# Altium footprint library Standard.PcbLib: 137 footprints (part 6 of 9)
Each footprint in its own frame and in the unit in brackets; x right, y up, seen from the top. Pads: shape width x height; smd on the part's side, far side on the other; paste and mask are expansions set on the pad; w line width, h text height; cw(c..) or ccw(c..) is an arc to the next point about the centre after c.
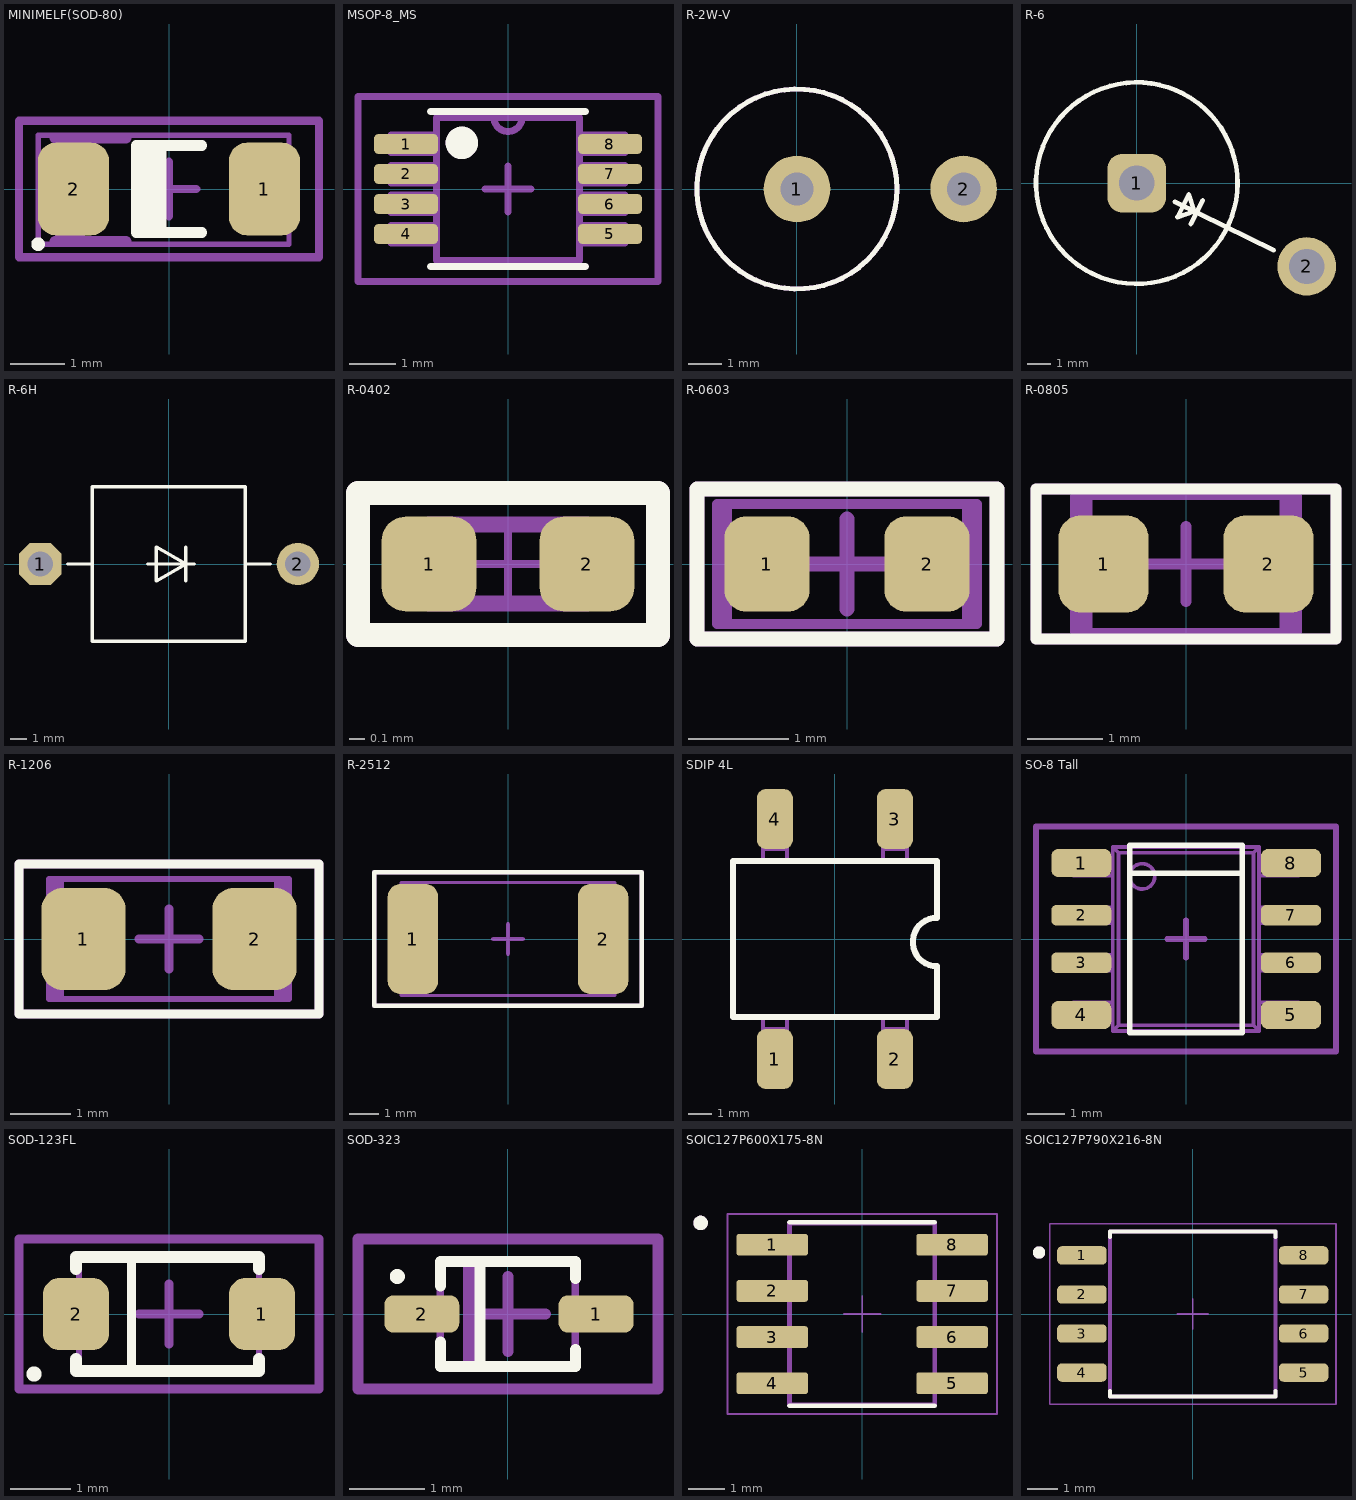
[diagram p5: the footprints below, top view; thin cyan lines are the x and y axes]

## MINIMELF(SOD-80) [mm] "SOD-80, MELF Diode, 2-Leads, Body 3,50x1,45mm, IPC Medium Density"
height 1.6
pads (2):
  rrect50% 1.3x1.7 smd: 1(1.75,0) 2(-1.75,0)
Top Overlay:
  circle w0.15: c-2.4,-1.011 r0.05
  region: -0.05,0.8 -0.6,0.8 -0.6,-0.8 -0.05,-0.8
  lines w0.2: 0.6,-0.8 -0.6,-0.8 -0.6,0.8 0.6,0.8
Top Assembly:
  region: -1.538,0.839 -2.088,0.839 -2.088,-0.961 -1.538,-0.961
  lines w0.1: -2.4,-1.011 2.2,-1.011 2.2,0.989 -2.4,0.989 -2.4,-1.011
  lines w0.2: -2.088,-0.961 -0.788,-0.961 ; -2.088,0.939 -0.788,0.939
Top Component Outline:
  lines w0.15: -0.5,0 0.5,0 ; 0,-0.5 0,0.5 ; -2.75,-1.25 2.75,-1.25 2.75,1.25 -2.75,1.25 -2.75,-1.25
3D body "Minimelf.step": height 1.4, standoff 0, extent -1.75,-0.689 1.75,0.711

## MSOP-8_MS [mil]
pads (8):
  rrect50% 55x17 smd: 1(-87,38.39) 2(-87,12.8) 3(-87,-12.8) 4(-87,-38.39) 5(87,-38.39) 6(87,-12.8) 7(87,12.8) 8(87,38.39)
Top Overlay:
  circle w23.62: c-39.37,39.37 r1.97
  lines w6: -66,-66 66,-66 ; -66,66 66,66
Top Assembly:
  circle w3.94: c-39.37,39.37 r11.81
  lines w6: -61,5 -100,5 -100,20 -61,20 ; -61,31 -100,31 -100,46 -61,46 ; -12,61 ccw(c0,61) 12,61 ; -12,61 12,61 ; -12,61 -61,61 -61,-61 61,-61 61,61 12,61 ; -100,-46 -100,-31 -61,-31 -61,-46 -100,-46 ; -100,-20 -100,-5 -61,-5 -61,-20 -100,-20 ; 61,-46 61,-31 100,-31 100,-46 61,-46 ; 61,-20 61,-5 100,-5 100,-20 61,-20 ; 61,5 61,20 100,20 100,5 61,5 ; 61,31 61,46 100,46 100,31 61,31
Top Component Outline:
  lines w5.91: -19.69,0 19.68,0 ; 0,-19.68 0,19.69 ; -127.95,-78.74 127.95,-78.74 127.95,78.74 -127.95,78.74 -127.95,-78.74
3D body "step_temp.STEP": height 43.46, standoff 0.15, extent -96.46,-59.05 96.45,59.06

## R-2W-V [mm] "Резистор 2W вертикальный"
pads (2):
  round 2 hole 1: 1(0,0) 2(5,0)
Top Overlay:
  circle w0.15: c0,0 r3
Top Assembly:
  circle w0.15: c0,0 r3
3D body "RESAD500W80L1600D500_2W.STEP": height 20.19, standoff -3.21, extent -2.5,-2.5 5.4,2.5

## R-6 [mm] "R-6 diode case"
pads (2):
  rrect50% 2.5x2.5 hole 1.5: 1(0,0)
  round 2.5 hole 1.5: 2(7.25,-3.55)
Top Overlay:
  circle w0.2: c0,0 r4.3
  lines w0.2: 1.617,-0.792 5.845,-2.862 ; 2.304,-1.743 2.816,-0.738 ; 1.739,-1.447 1.971,-0.983 2.221,-0.482 2.462,-1.206 1.739,-1.447
Top Assembly:
  circle w0.1: c0,0 r4.3
  lines w0.1: 1.617,-0.792 5.845,-2.862 ; 2.304,-1.743 2.816,-0.738 ; 1.739,-1.447 1.971,-0.983 2.221,-0.482 2.462,-1.206 1.739,-1.447
3D body "V-Diode P5.STEP": height 11.76, standoff -1.84, extent -4.279,-4.3 7.779,4.3

## R-6H [mm] "R-6 diode case"
pads (2):
  oct 2.5x2.5 hole 1.5: 1(-7.62,0)
  round 2.5 hole 1.5: 2(7.62,0)
Top Overlay:
  lines w0.2: -6,0 -4.547,0 ; -1.25,0 -0.5,0 1.5,0 ; 1,-1 1,1 ; 4.547,0 6,0 ; -4.547,-4.572 -4.547,4.572 4.5,4.572 4.5,-4.572 -4.547,-4.572 ; -0.75,-1 1,0 -0.75,1 -0.75,0.75 -0.75,-1
Top Assembly:
  lines w0.1: -6,0 -4.547,0 ; -1.25,0 -0.5,0 1.5,0 ; 1,-1 1,1 ; 4.547,0 6,0 ; -4.547,-4.572 -4.547,4.572 4.5,4.572 4.5,-4.572 -4.547,-4.572 ; -0.75,-1 1,0 -0.75,1 -0.75,0.75 -0.75,-1
3D body "User Library-Diode R-6 diameter 9_1 pitch 600mils.STEP": height 9.16, standoff -5.55, extent -8.255,-4.56 8.285,4.56

## R-0402 [mm]
height 0.6
pads (2):
  rrect50% 0.6x0.6 smd: 1(-0.5,0) 2(0.5,0)
Top Overlay:
  lines w0.15: -0.95,-0.45 -0.95,0.45 0.95,0.45 0.95,-0.45 -0.95,-0.45
Top Assembly:
  lines w0.1: -0.5,-0.25 0.5,-0.25 0.5,0.25 -0.5,0.25 -0.5,-0.25
Top Component Outline:
  lines w0.05: -0.25,0 0.25,0 ; 0,-0.25 0,0.25
  lines w0.15: -0.95,-0.45 -0.95,0.45 ; -0.925,-0.45 0.9,-0.45 ; -0.925,0.45 0.9,0.45 ; 0.95,-0.45 0.95,0.45
3D body "User Library-R_0402.STEP": height 0.35, standoff 0, extent -0.5,-0.25 0.5,0.25

## R-0603 [mm] "Chip Capacitor, 2-Leads, Body 1,60x0,83mm, IPC Medium Density"
height 0.6
pads (2):
  rrect50% 0.85x0.95 smd: 1(-0.8,0) 2(0.8,0)
Top Overlay:
  lines w0.15: -1.5,-0.75 -1.5,0.75 0,0.75 1.5,0.75 1.5,-0.75 0,-0.75 -1.5,-0.75
Top Assembly:
  lines w0.1: -1.2,-0.6 -1.2,0.6 ; 1.2,-0.6 1.2,0.6 ; -1.3,-0.6 -1.3,0.6 1.3,0.6 1.3,-0.6 -1.3,-0.6
Top Component Outline:
  lines w0.15: -0.45,0 0.45,0 ; 0,-0.45 0,0.45 ; -1.5,-0.75 -1.5,0.75 1.5,0.75 1.5,-0.75 -1.5,-0.75
3D body "SMD R-0603.STEP": height 0.45, standoff -0.01, extent -0.8,-0.4 0.8,0.4

## R-0805 [mm] "Chip Resistor, 2-Leads, Body 2,00x1,25mm, IPC Medium Density"
height 0.7
pads (2):
  rrect50% 1.2x1.3 smd: 1(-1.1,0) 2(1.1,0)
Top Overlay:
  lines w0.15: -2,-1 -2,1 2,1 2,-1 -2,-1
Top Assembly:
  rectangle: 1.3,-0.9 1.5,0.9
  rectangle: -1.5,-0.9 -1.3,0.9
  lines w0.1: -1.3,-0.9 -1.3,0.9 ; 1.3,-0.9 1.3,0.9 ; -1.5,-0.9 1.5,-0.9 1.5,0.9 -1.5,0.9 -1.5,-0.9
Top Component Outline:
  lines w0.15: -0.5,0 0.5,0 ; 0,-0.5 0,0.5 ; -2,-1 -2,1 2,1 2,-1 -2,-1
3D body "R-0805.STEP": height 0.6, standoff 0, extent -1,-0.625 1,0.625

## R-1206 [mm] "Chip Resistor, 2-Leads, Body 3,20x1,60mm, IPC Medium Density"
height 0.7
pads (2):
  rrect50% 1.4x1.7 smd: 1(-1.425,0) 2(1.425,0)
Top Overlay:
  lines w0.15: -2.5,-1.25 -2.5,1.25 -0.45,1.25 0.45,1.25 2.5,1.25 2.5,-1.25 0.45,-1.25 -0.45,-1.25 -2.5,-1.25
Top Assembly:
  rectangle: 1.75,-1 1.95,1
  rectangle: -1.95,-1 -1.75,1
  lines w0.1: -2,-1 -2,1 2,1 2,-1 -2,-1
Top Component Outline:
  lines w0.15: -0.5,0 0.5,0 ; 0,-0.5 0,0.5 ; -2.5,-1.25 -2.5,1.25 2.5,1.25 2.5,-1.25 -2.5,-1.25
3D body "R-1206 (2).STEP": height 0.6, standoff 0, extent -1.6,-0.8 1.6,0.8

## R-2512 [mm]
height 0.7
pads (2):
  rrect50% 1.7x3.7 smd: 1(-3.2,0) 2(3.2,0)
Top Overlay:
  lines w0.15: -4.5,-2.25 -4.5,2.25 4.5,2.25 4.5,-2.25 -4.5,-2.25
Top Assembly:
  rectangle: 2.8,-1.9 3.6,1.9
  rectangle: -3.6,-1.9 -2.8,1.9
  lines w0.1: -3.3,-1.9 -3.3,1.9 ; 3.3,-1.9 3.3,1.9 ; -3.6,-1.9 -3.6,1.9 3.6,1.9 3.6,-1.9 -3.6,-1.9
Top Component Outline:
  lines w0.15: -0.5,0 0.5,0 ; 0,-0.5 0,0.5 ; -4.5,-2.25 -4.5,2.25 4.5,2.25 4.5,-2.25 -4.5,-2.25
3D body "SMD R-2512.STEP": height 0.62, standoff 0, extent -3.16,-1.6 3.16,1.6

## SDIP 4L [mil] "4-LEAD,SDIP,6.5mm WIDE"
pads (4):
  rrect50% 60x100 smd: 1(-100,-200) 2(100,-200) 3(100,200) 4(-100,200)
Top Overlay:
  lines w10: 170,-45.31 cw(c170,-5) 170,35.31 ; 170,-45 170,-130 -170,-130 -170,130 170,130 170,35
Top Assembly:
  lines w7.01: -120,-150 -80,-150 ; -120,-130 -120,-190 -80,-190 -80,-130 ; -120,130 -120,190 -80,190 -80,130 ; -120,150 -80,150 ; 80,-150 120,-150 ; 80,-130 80,-190 120,-190 120,-130 ; 80,130 80,190 120,190 120,130 ; 80,150 120,150 ; 170,-45.31 cw(c170,-5) 170,35.31 ; 170,-45 170,-130 -170,-130 -170,130 170,130 170,35
  text "~~" at -157.48,-157.48 h62.5
  text "-" at -140,40 h62.5
  text "~~" at 78.74,-157.48 h62.5
  text "+" at 60,40 h62.5
3D body "User Library-DFS.STEP": height 102.76, standoff 0.6, extent -161.42,-206.69 161.42,198.82

## SO-8 Tall [mm] "SOIC, 8-Leads, Body 4,90x3,90mm, Pitch 1,27mm, IPC Medium Density"
height 1.75
pads (8):
  rrect50% 1.6x0.75 smd: 1(-2.793,2.025) 4(-2.793,-2.025) 5(2.8,-2.025) 8(2.8,2.025)
  rrect50% 1.6x0.55 smd: 2(-2.793,0.635) 3(-2.793,-0.635) 6(2.8,-0.635) 7(2.8,0.635)
Top Overlay:
  lines w0.15: -1.5,1.75 1.5,1.75 ; -1.5,-2.5 1.5,-2.5 1.5,2.5 -1.5,2.5 -1.5,-2.5
Top Assembly:
  circle w0.1: c-1.17,1.67 r0.338
  lines w0.1: -2.631,-2.115 -2.631,-1.695 ; -2.631,-2.115 -3,-2.115 -3,-1.695 -2.631,-1.695 ; -2.631,-2.115 -2.543,-2.115 ; -2.631,-1.695 -2.543,-1.695 ; -2.631,-0.845 -2.631,-0.425 ; -2.631,-0.845 -3,-0.845 -3,-0.425 -2.631,-0.425 ; -2.631,-0.845 -2.543,-0.845 ; -2.631,-0.425 -2.543,-0.425 ; -2.631,0.425 -2.631,0.845 ; -2.631,0.425 -3,0.425 -3,0.845 -2.631,0.845 ; -2.631,0.425 -2.543,0.425 ; -2.631,0.845 -2.543,0.845 ; -2.631,1.695 -2.631,2.115 ; -2.631,1.695 -3,1.695 -3,2.115 -2.631,2.115 ; -2.631,1.695 -2.543,1.695 ; -2.631,2.115 -2.543,2.115 ; -2.543,-2.115 -2.543,-1.695 ; -2.543,-2.115 -2.403,-2.115 ; -2.543,-1.695 -2.403,-1.695 ; -2.543,-0.845 -2.543,-0.425 ; -2.543,-0.845 -2.403,-0.845 ; -2.543,-0.425 -2.403,-0.425 ; -2.543,0.425 -2.543,0.845 ; -2.543,0.425 -2.403,0.425 ; -2.543,0.845 -2.403,0.845 ; -2.543,1.695 -2.543,2.115 ; -2.543,1.695 -2.403,1.695 ; -2.543,2.115 -2.403,2.115 ; -2.403,-2.115 -2.403,-1.695 ; -2.403,-2.115 -2.113,-2.115 ; -2.403,-1.695 -2.113,-1.695 ; -2.403,-0.845 -2.403,-0.425 ; -2.403,-0.845 -2.113,-0.845 ; -2.403,-0.425 -2.113,-0.425 ; -2.403,0.425 -2.403,0.845 ; -2.403,0.425 -2.113,0.425 ; -2.403,0.845 -2.113,0.845 ; -2.403,1.695 -2.403,2.115 ; -2.403,1.695 -2.113,1.695 ; -2.403,2.115 -2.113,2.115 ; -2.113,-2.115 -2.113,-1.695 ; -2.113,-2.115 -1.95,-2.115 ; -2.113,-1.695 -1.95,-1.695 ; -2.113,-0.845 -2.113,-0.425 ; -2.113,-0.845 -1.95,-0.845 ; -2.113,-0.425 -1.95,-0.425 ; -2.113,0.425 -2.113,0.845 ; -2.113,0.425 -1.95,0.425 ; -2.113,0.845 -1.95,0.845 ; -2.113,1.695 -2.113,2.115 ; -2.113,1.695 -1.95,1.695 ; -2.113,2.115 -1.95,2.115 ; -1.95,-2.45 1.95,-2.45 ; -1.95,-2.45 -1.95,-2.115 ; -1.95,-2.45 -1.801,-2.301 ; -1.95,-2.115 -1.95,-1.695 ; -1.95,-1.695 -1.95,-0.845 ; -1.95,-0.845 -1.95,-0.425 ; -1.95,-0.425 -1.95,0.425 ; -1.95,0.425 -1.95,0.845 ; -1.95,0.845 -1.95,1.695 ; -1.95,1.695 -1.95,2.115 ; -1.95,2.115 -1.95,2.45 ; -1.95,2.45 -1.801,2.301 ; -1.95,2.45 1.95,2.45 ; -1.801,-2.301 1.801,-2.301 ; -1.801,-2.301 -1.801,2.301 ; -1.801,2.301 1.801,2.301 ; 1.801,-2.301 1.95,-2.45 ; 1.801,-2.301 1.801,2.301 ; 1.801,2.301 1.95,2.45 ; 1.95,-2.45 1.95,-2.115 ; 1.95,-2.115 2.113,-2.115 ; 1.95,-2.115 1.95,-1.695 ; 1.95,-1.695 2.113,-1.695 ; 1.95,-1.695 1.95,-0.845 ; 1.95,-0.845 2.113,-0.845 ; 1.95,-0.845 1.95,-0.425 ; 1.95,-0.425 2.113,-0.425 ; 1.95,-0.425 1.95,0.425 ; 1.95,0.425 2.113,0.425 ; 1.95,0.425 1.95,0.845 ; 1.95,0.845 2.113,0.845 ; 1.95,0.845 1.95,1.695 ; 1.95,1.695 2.113,1.695 ; 1.95,1.695 1.95,2.115 ; 1.95,2.115 2.113,2.115 ; 1.95,2.115 1.95,2.45 ; 2.113,-2.115 2.113,-1.695 ; 2.113,-2.115 2.403,-2.115 ; 2.113,-1.695 2.403,-1.695 ; 2.113,-0.845 2.113,-0.425 ; 2.113,-0.845 2.403,-0.845 ; 2.113,-0.425 2.403,-0.425 ; 2.113,0.425 2.113,0.845 ; 2.113,0.425 2.403,0.425 ; 2.113,0.845 2.403,0.845 ; 2.113,1.695 2.113,2.115 ; 2.113,1.695 2.403,1.695 ; 2.113,2.115 2.403,2.115 ; 2.403,-2.115 2.403,-1.695 ; 2.403,-2.115 2.543,-2.115 ; 2.403,-1.695 2.543,-1.695 ; 2.403,-0.845 2.403,-0.425 ; 2.403,-0.845 2.543,-0.845 ; 2.403,-0.425 2.543,-0.425 ; 2.403,0.425 2.403,0.845 ; 2.403,0.425 2.543,0.425 ; 2.403,0.845 2.543,0.845 ; 2.403,1.695 2.403,2.115 ; 2.403,1.695 2.543,1.695 ; 2.403,2.115 2.543,2.115 ; 2.543,-2.115 2.543,-1.695 ; 2.543,-2.115 2.631,-2.115 ; 2.543,-1.695 2.631,-1.695 ; 2.543,-0.845 2.543,-0.425 ; 2.543,-0.845 2.631,-0.845 ; 2.543,-0.425 2.631,-0.425 ; 2.543,0.425 2.543,0.845 ; 2.543,0.425 2.631,0.425 ; 2.543,0.845 2.631,0.845 ; 2.543,1.695 2.543,2.115 ; 2.543,1.695 2.631,1.695 ; 2.543,2.115 2.631,2.115 ; 2.631,-2.115 2.631,-1.695 ; 2.631,-2.115 3,-2.115 3,-1.695 2.631,-1.695 ; 2.631,-0.845 2.631,-0.425 ; 2.631,-0.845 3,-0.845 3,-0.425 2.631,-0.425 ; 2.631,0.425 2.631,0.845 ; 2.631,0.425 3,0.425 3,0.845 2.631,0.845 ; 2.631,1.695 2.631,2.115 ; 2.631,1.695 3,1.695 3,2.115 2.631,2.115
Top Component Outline:
  lines w0.15: -0.5,0 0.5,0 ; 0,-0.5 0,0.5 ; -4,-3 4,-3 4,3 -4,3 -4,-3
3D body "User Library-SO8-HCPL.STEP": height 3.28, standoff -0.45, extent -3.003,-2.5 3.003,2.5

## SOD-123FL [mm] "SODFL, 2-Leads, Body 1,70x3,60mm, IPC Medium Density"
height 1.3
pads (2):
  rrect50% 1.1x1.2 smd: 1(1.55,0) 2(-1.55,0)
Top Overlay:
  circle w0.15: c-2.25,-1 r0.05
  lines w0.15: -0.625,-0.95 -0.625,0.95
  lines w0.2: -1.55,-0.75 -1.55,-0.95 1.5,-0.95 1.5,-0.75 ; -1.55,0.75 -1.55,0.95 1.5,0.95 1.5,0.75
Top Assembly:
  lines w0.1: -0.625,-0.9 -0.625,0.9 ; -1.5,-0.9 -1.5,0.9 1.5,0.9 1.5,-0.9 -1.5,-0.9
Top Component Outline:
  lines w0.15: -0.5,0 0.5,0 ; 0,-0.5 0,0.5 ; -2.5,-1.25 -2.5,1.25 2.5,1.25 2.5,-1.25 -2.5,-1.25
3D body "SODFL360X130-2N.step": height 1.3, standoff 0, extent -1.8,-0.9 1.8,0.9

## SOD-323 [mm] "SOD-323 SODFL, 2-Leads, Body 1,30x2,60mm, IPC Medium Density"
height 1
pads (2):
  rrect50% 1x0.5 smd: 1(1.175,0) 2(-1.15,0)
Top Overlay:
  circle w0.1: c-1.475,0.5 r0.05
  lines w0.15: -0.9,-0.375 -0.9,-0.7 0.9,-0.7 0.9,-0.475 ; -0.9,0.375 -0.9,0.7 0.9,0.7 0.9,0.475 ; -0.375,-0.7 -0.375,0.7
Top Assembly:
  region: -0.375,-0.7 -0.375,0.7 -0.6,0.7 -0.6,-0.7
  lines w0.1: -0.375,-0.7 -0.375,0.7 ; -1.274,-0.15 -1.274,0.15 ; -1.274,-0.15 -1.446,-0.15 -1.446,0.15 -1.274,0.15 ; -1.274,-0.15 -1.183,-0.15 ; -1.274,0.15 -1.183,0.15 ; -1.183,-0.15 -1.183,0.15 ; -1.183,-0.15 -1.171,-0.15 ; -1.183,0.15 -1.171,0.15 ; -1.171,-0.15 -1.171,0.15 ; -1.171,-0.15 -0.921,-0.15 ; -1.171,0.15 -0.921,0.15 ; -0.921,-0.15 -0.921,0.15 ; -0.921,-0.15 -0.9,-0.15 -0.9,0.15 -0.921,0.15 ; 0.921,-0.15 0.921,0.15 ; 0.921,-0.15 0.9,-0.15 0.9,0.15 0.921,0.15 ; 0.921,-0.15 1.171,-0.15 ; 0.921,0.15 1.171,0.15 ; 1.171,-0.15 1.171,0.15 ; 1.171,-0.15 1.183,-0.15 ; 1.171,0.15 1.183,0.15 ; 1.183,-0.15 1.183,0.15 ; 1.183,-0.15 1.274,-0.15 ; 1.183,0.15 1.274,0.15 ; 1.274,-0.15 1.274,0.15 ; 1.274,-0.15 1.446,-0.15 1.446,0.15 1.274,0.15 ; -0.9,-0.7 0.9,-0.7 0.9,0.7 -0.9,0.7 -0.9,-0.7
Top Component Outline:
  lines w0.15: -0.5,0 0.5,0 ; 0,-0.5 0,0.5 ; -2,-1 2,-1 2,1 -2,1 -2,-1
3D body "SOD-323.STEP": height 1.1, standoff 0, extent -1.295,-0.675 1.305,0.675

## SOIC127P600X175-8N [mm]
pads (8):
  rrect25% 1.97x0.6 smd: 1(-2.475,1.905) 2(-2.475,0.635) 3(-2.475,-0.635) 4(-2.475,-1.905) 5(2.475,-1.905) 6(2.475,-0.635) 7(2.475,0.635) 8(2.475,1.905)
Top Overlay:
  circle w0.2: c-4.445,2.505 r0.1
  lines w0.127: -2,-2.525 2,-2.525 ; -2,2.525 2,2.525
Top Assembly:
  circle w0.2: c-4.445,2.505 r0.1
  lines w0.127: -2,-2.5 -2,2.5 2,2.5 2,-2.5 -2,-2.5
Top Component Outline:
  lines w0.05: -0.5,0 0.5,0 ; 0,-0.5 0,0.5 ; -3.71,-2.75 -3.71,2.75 3.71,2.75 3.71,-2.75 -3.71,-2.75
3D body "User Library-SOIC-8-1.step": height 1.75, standoff 0, extent -3,-2.45 3,2.45

## SOIC127P790X216-8N [mm]
pads (8):
  rrect50% 1.61x0.6 smd: 1(-3.605,1.905) 2(-3.605,0.635) 3(-3.605,-0.635) 4(-3.605,-1.905) 5(3.605,-1.905) 6(3.605,-0.635) 7(3.605,0.635) 8(3.605,1.905)
Top Overlay:
  circle w0.2: c-5,2 r0.1
  lines w0.127: -2.69,-2.51 -2.69,-2.69 2.69,-2.69 2.69,-2.51 ; -2.69,2.51 -2.69,2.69 2.69,2.69 2.69,2.51
Top Assembly:
  circle w0.2: c-5,2 r0.1
  lines w0.127: -2.69,-2.69 2.69,-2.69 2.69,2.69 -2.69,2.69 -2.69,-2.69
Top Component Outline:
  lines w0.05: -0.5,0 0.5,0 ; 0,-0.5 0,0.5 ; -4.66,-2.94 4.66,-2.94 4.66,2.94 -4.66,2.94 -4.66,-2.94
3D body "User Library-SOIC8_Wide_5mmx5mm.STEP": height 1.75, standoff -0.01, extent -4.052,-2.73 4.05,2.73